# Altium footprint library PCI_custom_98.PcbLib: 4 footprints
Each footprint in its own frame and in the unit in brackets; x right, y up, seen from the top. Pads: shape width x height; smd on the part's side, far side on the other; paste and mask are expansions set on the pad; w line width, h text height; cw(c..) or ccw(c..) is an arc to the next point about the centre after c.
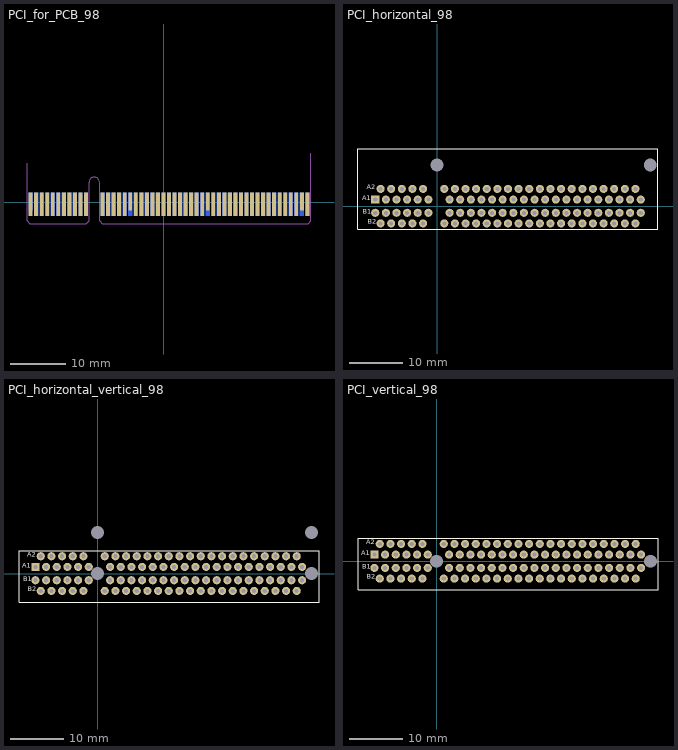
[diagram p0: the footprints below, top view; thin cyan lines are the x and y axes]

## PCI_for_PCB_98 [mm]
pads (98):
  rect 0.7x3.2 smd far side: A1(-24.014,0.119)
  rect 0.7x4.2 smd far side: A2(-23.014,-0.381) A3(-22.014,-0.381) A4(-21.014,-0.381) A5(-20.014,-0.381) A6(-19.014,-0.381) A7(-18.014,-0.381) A8(-17.014,-0.381) A9(-16.014,-0.381) A10(-15.014,-0.381) A11(-14.014,-0.381) A12(-11.014,-0.381) A13(-10.014,-0.381) A14(-9.014,-0.381) A15(-8.014,-0.381) A16(-7.014,-0.381) A17(-6.014,-0.381) A18(-5.014,-0.381) A19(-4.014,-0.381) A20(-3.014,-0.381) A21(-2.014,-0.381) A22(-1.014,-0.381) A23(-0.014,-0.381) A24(0.986,-0.381) A25(1.986,-0.381) A26(2.986,-0.381) A27(3.986,-0.381) A28(4.986,-0.381) A29(5.986,-0.381) A30(6.986,-0.381) A31(7.986,-0.381) A32(8.986,-0.381) A33(9.986,-0.381) A34(10.986,-0.381) A35(11.986,-0.381) A36(12.986,-0.381) A37(13.986,-0.381) A38(14.986,-0.381) A39(15.986,-0.381) A40(16.986,-0.381) A41(17.986,-0.381) A42(18.986,-0.381) A43(19.986,-0.381) A44(20.986,-0.381) A45(21.986,-0.381) A46(22.986,-0.381) A47(23.986,-0.381) A48(24.986,-0.381) A49(25.986,-0.381)
  rect 0.7x4.2 smd: B1(-24.014,-0.381) B2(-23.014,-0.381) B3(-22.014,-0.381) B4(-21.014,-0.381) B5(-20.014,-0.381) B6(-19.014,-0.381) B7(-18.014,-0.381) B8(-17.014,-0.381) B9(-16.014,-0.381) B10(-15.014,-0.381) B11(-14.014,-0.381) B12(-11.014,-0.381) B13(-10.014,-0.381) B14(-9.014,-0.381) B15(-8.014,-0.381) B16(-7.014,-0.381) B18(-5.014,-0.381) B19(-4.014,-0.381) B20(-3.014,-0.381) B21(-2.014,-0.381) B22(-1.014,-0.381) B23(-0.014,-0.381) B24(0.986,-0.381) B25(1.986,-0.381) B26(2.986,-0.381) B27(3.986,-0.381) B28(4.986,-0.381) B29(5.986,-0.381) B30(6.986,-0.381) B32(8.986,-0.381) B33(9.986,-0.381) B34(10.986,-0.381) B35(11.986,-0.381) B36(12.986,-0.381) B37(13.986,-0.381) B38(14.986,-0.381) B39(15.986,-0.381) B40(16.986,-0.381) B41(17.986,-0.381) B42(18.986,-0.381) B43(19.986,-0.381) B44(20.986,-0.381) B45(21.986,-0.381) B46(22.986,-0.381) B47(23.986,-0.381) B49(25.986,-0.381)
  rect 0.7x3.2 smd: B17(-6.014,0.119) B31(7.986,0.119) B48(24.986,0.119)
Top Solder:
  rectangle: -24.914,-4.131 26.886,1.844
Bottom Solder:
  rectangle: -24.914,-4.131 26.886,1.844
Mechanical 1:
  lines w0.1: -24.664,7.044 -24.664,-3.381 -24.164,-3.881 -13.964,-3.881 -13.464,-3.381 -13.464,3.569 cw(c-12.514,3.569) -11.564,3.569 -11.564,-3.381 -11.064,-3.881 26.136,-3.881 26.636,-3.381 26.636,8.869

## PCI_horizontal_98 [mil]
pads (100):
  rect 60x60 hole 30: A1(-458.66,49.21)
  round 60 hole 30: A2(-419.29,127.95) A3(-379.92,49.21) A4(-340.55,127.95) A5(-301.18,49.21) A6(-261.81,127.95) A7(-222.44,49.21) A8(-183.07,127.95) A9(-143.7,49.21) A10(-104.33,127.95) A11(-64.96,49.21) A12(53.15,127.95) A13(92.52,49.21) A14(131.89,127.95) A15(171.26,49.21) A16(210.63,127.95) A17(250,49.21) A18(289.37,127.95) A19(328.74,49.21) A20(368.11,127.95) A21(407.48,49.21) A22(446.85,127.95) A23(486.22,49.21) A24(525.59,127.95) A25(564.96,49.21) A26(604.33,127.95) A27(643.7,49.21) A28(683.07,127.95) A29(722.44,49.21) A30(761.81,127.95) A31(801.18,49.21) A32(840.55,127.95) A33(879.92,49.21) A34(919.29,127.95) A35(958.66,49.21) A36(998.03,127.95) A37(1037.4,49.21) A38(1076.77,127.95) A39(1116.14,49.21) A40(1155.51,127.95) A41(1194.88,49.21) A42(1234.25,127.95) A43(1273.62,49.21) A44(1312.99,127.95) A45(1352.36,49.21) A46(1391.73,127.95) A47(1431.1,49.21) A48(1470.47,127.95) A49(1509.84,49.21) B1(-458.66,-49.21) B2(-419.29,-127.95) B3(-379.92,-49.21) B4(-340.55,-127.95) B5(-301.18,-49.21) B6(-261.81,-127.95) B7(-222.44,-49.21) B8(-183.07,-127.95) B9(-143.7,-49.21) B10(-104.33,-127.95) B11(-64.96,-49.21) B12(53.15,-127.95) B13(92.52,-49.21) B14(131.89,-127.95) B15(171.26,-49.21) B16(210.63,-127.95) B17(250,-49.21) B18(289.37,-127.95) B19(328.74,-49.21) B20(368.11,-127.95) B21(407.48,-49.21) B22(446.85,-127.95) B23(486.22,-49.21) B24(525.59,-127.95) B25(564.96,-49.21) B26(604.33,-127.95) B27(643.7,-49.21) B28(683.07,-127.95) B29(722.44,-49.21) B30(761.81,-127.95) B31(801.18,-49.21) B32(840.55,-127.95) B33(879.92,-49.21) B34(919.29,-127.95) B35(958.66,-49.21) B36(998.03,-127.95) B37(1037.4,-49.21) B38(1076.77,-127.95) B39(1116.14,-49.21) B40(1155.51,-127.95) B41(1194.88,-49.21) B42(1234.25,-127.95) B43(1273.62,-49.21) B44(1312.99,-127.95) B45(1352.36,-49.21) B46(1391.73,-127.95) B47(1431.1,-49.21) B48(1470.47,-127.95) B49(1509.84,-49.21)
  round 39.37 hole 94.49: ""(0,304.33) ""(1580.71,304.33)
Top Overlay:
  lines w5.91: -586.61,-172.83 -586.61,427.17 1637.8,427.17 1637.8,-172.83 -586.61,-172.83
  text "A1" at -555,30 h60
  text "A2" at -520,110 h60
  text "B2" at -515,-145 h60
  text "B1" at -550,-70 h60

## PCI_horizontal_vertical_98 [mil]
pads (102):
  rect 60x60 hole 30: A1(-458.66,49.21)
  round 60 hole 30: A2(-419.29,127.95) A3(-379.92,49.21) A4(-340.55,127.95) A5(-301.18,49.21) A6(-261.81,127.95) A7(-222.44,49.21) A8(-183.07,127.95) A9(-143.7,49.21) A10(-104.33,127.95) A11(-64.96,49.21) A12(53.15,127.95) A13(92.52,49.21) A14(131.89,127.95) A15(171.26,49.21) A16(210.63,127.95) A17(250,49.21) A18(289.37,127.95) A19(328.74,49.21) A20(368.11,127.95) A21(407.48,49.21) A22(446.85,127.95) A23(486.22,49.21) A24(525.59,127.95) A25(564.96,49.21) A26(604.33,127.95) A27(643.7,49.21) A28(683.07,127.95) A29(722.44,49.21) A30(761.81,127.95) A31(801.18,49.21) A32(840.55,127.95) A33(879.92,49.21) A34(919.29,127.95) A35(958.66,49.21) A36(998.03,127.95) A37(1037.4,49.21) A38(1076.77,127.95) A39(1116.14,49.21) A40(1155.51,127.95) A41(1194.88,49.21) A42(1234.25,127.95) A43(1273.62,49.21) A44(1312.99,127.95) A45(1352.36,49.21) A46(1391.73,127.95) A47(1431.1,49.21) A48(1470.47,127.95) A49(1509.84,49.21) B1(-458.66,-49.21) B2(-419.29,-127.95) B3(-379.92,-49.21) B4(-340.55,-127.95) B5(-301.18,-49.21) B6(-261.81,-127.95) B7(-222.44,-49.21) B8(-183.07,-127.95) B9(-143.7,-49.21) B10(-104.33,-127.95) B11(-64.96,-49.21) B12(53.15,-127.95) B13(92.52,-49.21) B14(131.89,-127.95) B15(171.26,-49.21) B16(210.63,-127.95) B17(250,-49.21) B18(289.37,-127.95) B19(328.74,-49.21) B20(368.11,-127.95) B21(407.48,-49.21) B22(446.85,-127.95) B23(486.22,-49.21) B24(525.59,-127.95) B25(564.96,-49.21) B26(604.33,-127.95) B27(643.7,-49.21) B28(683.07,-127.95) B29(722.44,-49.21) B30(761.81,-127.95) B31(801.18,-49.21) B32(840.55,-127.95) B33(879.92,-49.21) B34(919.29,-127.95) B35(958.66,-49.21) B36(998.03,-127.95) B37(1037.4,-49.21) B38(1076.77,-127.95) B39(1116.14,-49.21) B40(1155.51,-127.95) B41(1194.88,-49.21) B42(1234.25,-127.95) B43(1273.62,-49.21) B44(1312.99,-127.95) B45(1352.36,-49.21) B46(1391.73,-127.95) B47(1431.1,-49.21) B48(1470.47,-127.95) B49(1509.84,-49.21)
  round 39.37 hole 94.49: ""(0,0) ""(0,304.33) ""(1580.71,0) ""(1580.71,304.33)
Top Overlay:
  lines w5.91: -580,-210 1635,-210 1635,170 -580,170 -580,-210
  text "A1" at -555,30 h60
  text "A2" at -520,110 h60
  text "B2" at -515,-145 h60
  text "B1" at -550,-70 h60
3D body "877159208.stp": height 443.31, standoff -170.87, extent -575,-204.21 1629.73,144.21

## PCI_vertical_98 [mil]
pads (100):
  rect 60x60 hole 30: A1(-458.66,49.21)
  round 60 hole 30: A2(-419.29,127.95) A3(-379.92,49.21) A4(-340.55,127.95) A5(-301.18,49.21) A6(-261.81,127.95) A7(-222.44,49.21) A8(-183.07,127.95) A9(-143.7,49.21) A10(-104.33,127.95) A11(-64.96,49.21) A12(53.15,127.95) A13(92.52,49.21) A14(131.89,127.95) A15(171.26,49.21) A16(210.63,127.95) A17(250,49.21) A18(289.37,127.95) A19(328.74,49.21) A20(368.11,127.95) A21(407.48,49.21) A22(446.85,127.95) A23(486.22,49.21) A24(525.59,127.95) A25(564.96,49.21) A26(604.33,127.95) A27(643.7,49.21) A28(683.07,127.95) A29(722.44,49.21) A30(761.81,127.95) A31(801.18,49.21) A32(840.55,127.95) A33(879.92,49.21) A34(919.29,127.95) A35(958.66,49.21) A36(998.03,127.95) A37(1037.4,49.21) A38(1076.77,127.95) A39(1116.14,49.21) A40(1155.51,127.95) A41(1194.88,49.21) A42(1234.25,127.95) A43(1273.62,49.21) A44(1312.99,127.95) A45(1352.36,49.21) A46(1391.73,127.95) A47(1431.1,49.21) A48(1470.47,127.95) A49(1509.84,49.21) B1(-458.66,-49.21) B2(-419.29,-127.95) B3(-379.92,-49.21) B4(-340.55,-127.95) B5(-301.18,-49.21) B6(-261.81,-127.95) B7(-222.44,-49.21) B8(-183.07,-127.95) B9(-143.7,-49.21) B10(-104.33,-127.95) B11(-64.96,-49.21) B12(53.15,-127.95) B13(92.52,-49.21) B14(131.89,-127.95) B15(171.26,-49.21) B16(210.63,-127.95) B17(250,-49.21) B18(289.37,-127.95) B19(328.74,-49.21) B20(368.11,-127.95) B21(407.48,-49.21) B22(446.85,-127.95) B23(486.22,-49.21) B24(525.59,-127.95) B25(564.96,-49.21) B26(604.33,-127.95) B27(643.7,-49.21) B28(683.07,-127.95) B29(722.44,-49.21) B30(761.81,-127.95) B31(801.18,-49.21) B32(840.55,-127.95) B33(879.92,-49.21) B34(919.29,-127.95) B35(958.66,-49.21) B36(998.03,-127.95) B37(1037.4,-49.21) B38(1076.77,-127.95) B39(1116.14,-49.21) B40(1155.51,-127.95) B41(1194.88,-49.21) B42(1234.25,-127.95) B43(1273.62,-49.21) B44(1312.99,-127.95) B45(1352.36,-49.21) B46(1391.73,-127.95) B47(1431.1,-49.21) B48(1470.47,-127.95) B49(1509.84,-49.21)
  round 39.37 hole 94.49: ""(0,0) ""(1580.71,0)
Top Overlay:
  lines w5.91: -580,-210 1635,-210 1635,170 -580,170 -580,-210
  text "A1" at -555,30 h60
  text "A2" at -520,110 h60
  text "B2" at -515,-145 h60
  text "B1" at -550,-70 h60
3D body "877159208.stp": height 443.31, standoff -170.87, extent -575,-204.21 1629.73,144.21